# Altium footprint library Connectors Molex.PcbLib: 105 footprints (part 4 of 7)
Each footprint in its own frame and in the unit in brackets; x right, y up, seen from the top. Pads: shape width x height; smd on the part's side, far side on the other; paste and mask are expansions set on the pad; w line width, h text height; cw(c..) or ccw(c..) is an arc to the next point about the centre after c.
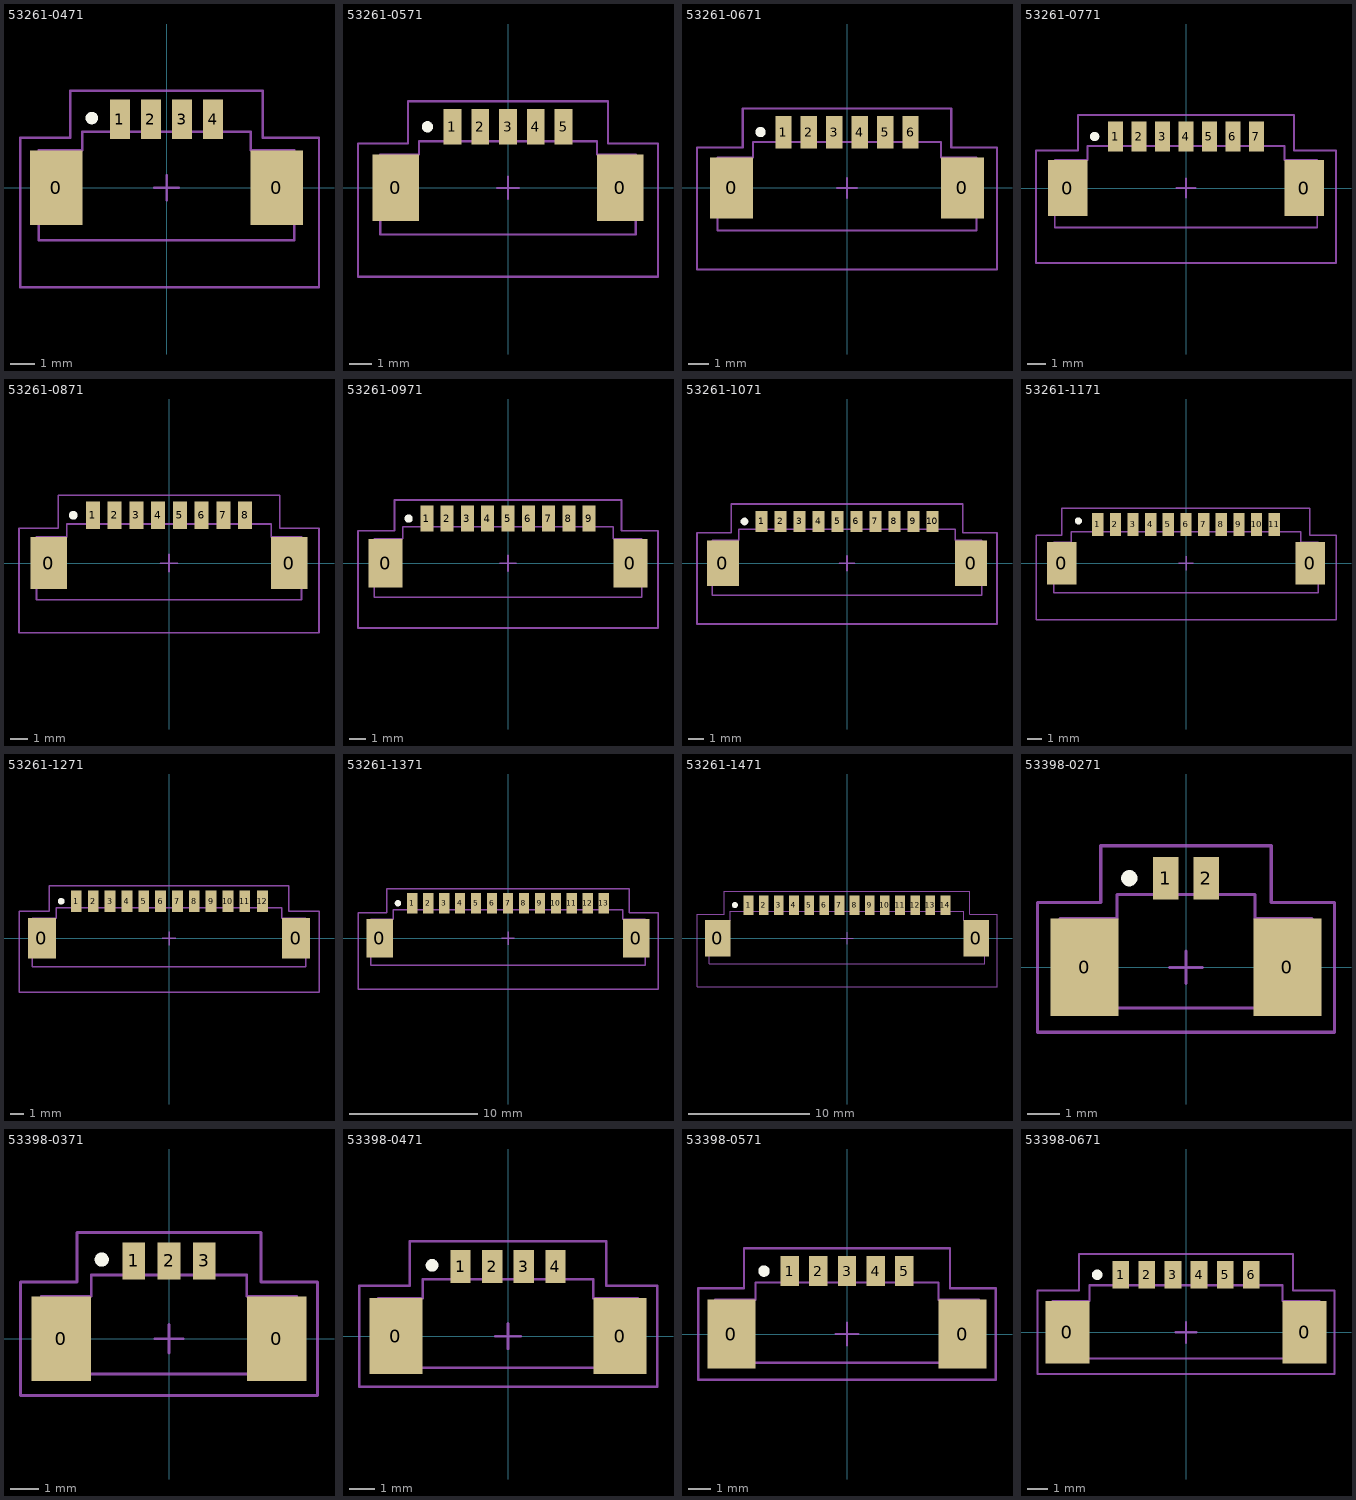
[diagram p3: the footprints below, top view; thin cyan lines are the x and y axes]

## 53261-0471 [mm] "PicoBlade™ 53261-0471"
height 3.4
pads (6):
  rect 2.1x3 smd: 0(-4.425,0) 0(4.425,0)
  rect 0.8x1.6 smd: 1(-1.875,2.75) 2(-0.625,2.75) 3(0.625,2.75) 4(1.875,2.75)
Top Overlay:
  circle w0.25: c-3,2.798 r0.125
Mechanical 1:
  lines w0.1: -5.125,-2.1 -5.125,1.5 -3.375,1.5 -3.375,2.25 3.375,2.25 3.375,1.5 5.125,1.5 5.125,-2.1 -5.125,-2.1
Mechanical 13:
  lines w0.1: -4.125,-0.75 -4.125,1 -4.625,0.5 ; -2.125,2.25 -2.125,3.25 -1.625,3.25 -1.625,2.25 ; -0.875,2.25 -0.875,3.25 -0.375,3.25 -0.375,2.25 ; 0.375,2.25 0.375,3.25 0.875,3.25 0.875,2.25 ; 1.625,2.25 1.625,3.25 2.125,3.25 2.125,2.25 ; -4.625,0.5 -4.625,0.5 ; -5.125,-2.1 -5.125,1.5 -3.375,1.5 -3.375,2.25 3.375,2.25 3.375,1.5 5.125,1.5 5.125,-2.1 -5.125,-2.1
  text ".Designator" at -2.675,-0.25 h1.5
Mechanical 15:
  lines w0.1: -0.5,0 0.5,0 ; 0,-0.5 0,0.5 ; -5.875,-4 -5.875,2 -3.875,2 -3.875,3.9 -3.475,3.9 3.875,3.9 3.875,2 6.125,2 6.125,-4 -5.875,-4
3D body "532610471.stp": height 3.4, standoff 0, extent -5.075,-2.1 5.075,3.1

## 53261-0571 [mm] "PicoBlade™ 53261-0571"
height 3.4
pads (7):
  rect 2.1x3 smd: 0(-5.05,0) 0(5.05,0)
  rect 0.8x1.6 smd: 1(-2.5,2.75) 2(-1.25,2.75) 3(0,2.75) 4(1.25,2.75) 5(2.5,2.75)
Top Overlay:
  circle w0.25: c-3.625,2.75 r0.125
Mechanical 1:
  lines w0.1: -5.75,-2.1 5.75,-2.1 5.75,1.5 4,1.5 4,2.1 -4,2.1 -4,1.5 -5.75,1.5 -5.75,-2.1
Mechanical 13:
  lines w0.1: -5.25,0.5 -4.75,1 -4.75,-0.75 ; -2.75,2.1 -2.75,3.1 -2.25,3.1 -2.25,2.1 ; -1.5,2.1 -1.5,3.1 -1,3.1 -1,2.1 ; -0.25,2.1 -0.25,3.1 0.25,3.1 0.25,2.1 ; 1,2.1 1,3.1 1.5,3.1 1.5,2.1 ; 2.25,2.1 2.25,3.1 2.75,3.1 2.75,2.1 ; -5.75,-2.1 5.75,-2.1 5.75,1.5 4,1.5 4,2.1 -4,2.1 -4,1.5 -5.75,1.5 -5.75,-2.1
  text ".Designator" at -1.85,-0.325 h1.5
Mechanical 15:
  lines w0.1: -0.5,0 0.5,0 ; 0,-0.5 0,0.5 ; -6.75,-4 6.75,-4 6.75,2 4.5,2 4.5,3.9 -4.5,3.9 -4.5,2 -6.75,2 -6.75,-4
3D body "532610571.stp": height 3.4, standoff 0, extent -5.7,-2.1 5.7,3.1

## 53261-0671 [mm] "PicoBlade™ 53261-0671"
height 3.4
pads (8):
  rect 2.1x3 smd: 0(-5.675,0) 0(5.675,0)
  rect 0.8x1.6 smd: 1(-3.125,2.75) 2(-1.875,2.75) 3(-0.625,2.75) 4(0.625,2.75) 5(1.875,2.75) 6(3.125,2.75)
Top Overlay:
  circle w0.25: c-4.25,2.75 r0.125
Mechanical 1:
  lines w0.1: -6.375,-2.1 -6.375,1.5 -4.625,1.5 -4.625,2.25 4.625,2.25 4.625,1.5 6.375,1.5 6.375,-2.1 -6.375,-2.1
Mechanical 13:
  lines w0.1: -5.875,0.5 -5.375,1 -5.375,-0.75 ; -3.375,2.25 -3.375,3.25 -2.875,3.25 -2.875,2.25 ; -2.125,2.25 -2.125,3.25 -1.625,3.25 -1.625,2.25 ; -0.875,2.25 -0.875,3.25 -0.375,3.25 -0.375,2.25 ; 0.375,2.25 0.375,3.25 0.875,3.25 0.875,2.25 ; 1.625,2.25 1.625,3.25 2.125,3.25 2.125,2.25 ; 2.875,2.25 2.875,3.25 3.375,3.25 3.375,2.25 ; -6.375,-2.1 -6.375,1.5 -4.625,1.5 -4.625,2.25 4.625,2.25 4.625,1.5 6.375,1.5 6.375,-2.1 -6.375,-2.1
  text ".Designator" at -1.85,-0.4 h1.5
Mechanical 15:
  lines w0.1: -0.5,0 0.5,0 ; 0,-0.5 0,0.5 ; -7.375,-4 -7.375,2 -5.125,2 -5.125,3.9 -3.475,3.9 5.125,3.9 5.125,2 7.375,2 7.375,-4 -7.375,-4
3D body "532610671.stp": height 3.4, standoff 0, extent -6.325,-2.1 6.325,3.1

## 53261-0771 [mm] "PicoBlade™ 53261-0771"
height 3.4
pads (9):
  rect 2.1x3 smd: 0(-6.3,0) 0(6.3,0)
  rect 0.8x1.6 smd: 1(-3.75,2.75) 2(-2.5,2.75) 3(-1.25,2.75) 4(0,2.75) 5(1.25,2.75) 6(2.5,2.75) 7(3.75,2.75)
Top Overlay:
  circle w0.25: c-4.875,2.75 r0.125
Mechanical 1:
  lines w0.1: -7,-2.1 7,-2.1 7,1.5 5.25,1.5 5.25,2.25 -5.25,2.25 -5.25,1.5 -7,1.5 -7,-2.1
Mechanical 13:
  lines w0.1: -6.5,0.5 -6,1 -6,-0.75 ; -4,2.25 -4,3.25 -3.5,3.25 -3.5,2.25 ; -2.75,2.25 -2.75,3.25 -2.25,3.25 -2.25,2.25 ; -1.5,2.25 -1.5,3.25 -1,3.25 -1,2.25 ; -0.25,2.25 -0.25,3.25 0.25,3.25 0.25,2.25 ; 1,2.25 1,3.25 1.5,3.25 1.5,2.25 ; 2.25,2.25 2.25,3.25 2.75,3.25 2.75,2.25 ; 3.5,2.25 3.5,3.25 4,3.25 4,2.25 ; -7,-2.1 7,-2.1 7,1.5 5.25,1.5 5.25,2.25 -5.25,2.25 -5.25,1.5 -7,1.5 -7,-2.1
  text ".Designator" at -2.05,-0.3 h1.5
Mechanical 15:
  lines w0.1: -0.5,0 0.5,0 ; 0,-0.5 0,0.5 ; -8,-4 8,-4 8,2 5.75,2 5.75,3.9 -2.85,3.9 -5.75,3.9 -5.75,2 -8,2 -8,-4
3D body "532610771.stp": height 3.4, standoff 0, extent -6.95,-2.1 6.95,3.1

## 53261-0871 [mm] "PicoBlade™ 53261-0871"
height 3.4
pads (10):
  rect 2.1x3 smd: 0(-6.925,0) 0(6.925,0)
  rect 0.8x1.6 smd: 1(-4.375,2.75) 2(-3.125,2.75) 3(-1.875,2.75) 4(-0.625,2.75) 5(0.625,2.75) 6(1.875,2.75) 7(3.125,2.75) 8(4.375,2.75)
Top Overlay:
  circle w0.25: c-5.5,2.75 r0.125
Mechanical 1:
  lines w0.1: -7.625,-2.1 7.625,-2.1 7.625,1.5 5.875,1.5 5.875,2.25 -5.875,2.25 -5.875,1.5 -7.625,1.5 -7.625,-2.1
Mechanical 13:
  lines w0.1: -7.125,0.5 -6.625,1 -6.625,-0.75 ; -4.625,2.25 -4.625,3.25 -4.125,3.25 -4.125,2.25 ; -3.375,2.25 -3.375,3.25 -2.875,3.25 -2.875,2.25 ; -2.125,2.25 -2.125,3.25 -1.625,3.25 -1.625,2.25 ; -0.875,2.25 -0.875,3.25 -0.375,3.25 -0.375,2.25 ; 0.375,2.25 0.375,3.25 0.875,3.25 0.875,2.25 ; 1.625,2.25 1.625,3.25 2.125,3.25 2.125,2.25 ; 2.875,2.25 2.875,3.25 3.375,3.25 3.375,2.25 ; 4.125,2.25 4.125,3.25 4.625,3.25 4.625,2.25 ; -7.625,-2.1 7.625,-2.1 7.625,1.5 5.875,1.5 5.875,2.25 -5.875,2.25 -5.875,1.5 -7.625,1.5 -7.625,-2.1
  text ".Designator" at -2.225,-0.375 h1.5
Mechanical 15:
  lines w0.1: -0.5,0 0.5,0 ; 0,-0.5 0,0.5 ; -8.625,-4 8.625,-4 8.625,2 6.375,2 6.375,3.9 -3.475,3.9 -6.375,3.9 -6.375,2 -8.625,2 -8.625,-4
3D body "532610871.stp": height 3.4, standoff 0, extent -7.575,-2.1 7.575,3.1

## 53261-0971 [mm] "PicoBlade™ 53261-0971"
height 3.4
pads (11):
  rect 2.1x3 smd: 0(-7.55,0) 0(7.55,0)
  rect 0.8x1.6 smd: 1(-5,2.75) 2(-3.75,2.75) 3(-2.5,2.75) 4(-1.25,2.75) 5(0,2.75) 6(1.25,2.75) 7(2.5,2.75) 8(3.75,2.75) 9(5,2.75)
Top Overlay:
  circle w0.25: c-6.125,2.75 r0.125
Mechanical 1:
  lines w0.1: -8.25,-2.1 -8.25,1.5 -6.5,1.5 -6.5,2.25 6.5,2.25 6.5,1.5 8.25,1.5 8.25,-2.1 -8.25,-2.1
Mechanical 13:
  lines w0.1: -7.75,0.5 -7.25,1 -7.25,-0.75 ; -5.25,2.25 -5.25,3.25 -4.75,3.25 -4.75,2.25 ; -4,2.25 -4,3.25 -3.5,3.25 -3.5,2.25 ; -2.75,2.25 -2.75,3.25 -2.25,3.25 -2.25,2.25 ; -1.5,2.25 -1.5,3.25 -1,3.25 -1,2.25 ; -0.25,2.25 -0.25,3.25 0.25,3.25 0.25,2.25 ; 1,2.25 1,3.25 1.5,3.25 1.5,2.25 ; 2.25,2.25 2.25,3.25 2.75,3.25 2.75,2.25 ; 3.5,2.25 3.5,3.25 4,3.25 4,2.25 ; 4.75,2.25 4.75,3.25 5.25,3.25 5.25,2.25 ; -8.25,-2.1 -8.25,1.5 -6.5,1.5 -6.5,2.25 6.5,2.25 6.5,1.5 8.25,1.5 8.25,-2.1 -8.25,-2.1
  text ".Designator" at -2.05,-0.325 h1.5
Mechanical 15:
  lines w0.1: -0.5,0 0.5,0 ; 0,-0.5 0,0.5 ; -9.25,-4 -9.25,2 -7,2 -7,3.9 -2.85,3.9 7,3.9 7,2 9.25,2 9.25,-4 -9.25,-4
3D body "532610971.stp": height 3.4, standoff 0, extent -8.2,-2.1 8.2,3.1

## 53261-1071 [mm] "PicoBlade™ 53261-1071"
height 3.4
pads (12):
  rect 2.1x3 smd: 0(-8.175,0) 0(8.175,0)
  rect 0.8x1.4 smd: 1(-5.625,2.75) 2(-4.375,2.75) 3(-3.125,2.75) 4(-1.875,2.75) 5(-0.625,2.75) 6(0.625,2.75) 7(1.875,2.75) 8(3.125,2.75) 9(4.375,2.75) 10(5.625,2.75)
Top Overlay:
  circle w0.25: c-6.75,2.75 r0.125
Mechanical 1:
  lines w0.1: -8.875,-2.1 -8.875,1.5 -7.125,1.5 -7.125,2.25 7.125,2.25 7.125,1.5 8.875,1.5 8.875,-2.1 -8.875,-2.1
Mechanical 13:
  lines w0.1: -8.375,0.5 -7.875,1 -7.875,-0.75 ; -5.875,2.25 -5.875,3.25 -5.375,3.25 -5.375,2.25 ; -4.625,2.25 -4.625,3.25 -4.125,3.25 -4.125,2.25 ; -3.375,2.25 -3.375,3.25 -2.875,3.25 -2.875,2.25 ; -2.125,2.25 -2.125,3.25 -1.625,3.25 -1.625,2.25 ; -0.875,2.25 -0.875,3.25 -0.375,3.25 -0.375,2.25 ; 0.375,2.25 0.375,3.25 0.875,3.25 0.875,2.25 ; 1.625,2.25 1.625,3.25 2.125,3.25 2.125,2.25 ; 2.875,2.25 2.875,3.25 3.375,3.25 3.375,2.25 ; 4.125,2.25 4.125,3.25 4.625,3.25 4.625,2.25 ; 5.375,2.25 5.375,3.25 5.875,3.25 5.875,2.25 ; -8.875,-2.1 -8.875,1.5 -7.125,1.5 -7.125,2.25 7.125,2.25 7.125,1.5 8.875,1.5 8.875,-2.1 -8.875,-2.1
  text ".Designator" at -2.025,-0.35 h1.5
Mechanical 15:
  lines w0.1: -0.5,0 0.5,0 ; 0,-0.5 0,0.5 ; -9.875,-4 -9.875,2 -7.625,2 -7.625,3.9 -3.475,3.9 7.625,3.9 7.625,2 9.875,2 9.875,-4 -9.875,-4
3D body "532611071.stp": height 3.4, standoff 0, extent -8.825,-2.1 8.825,3.1

## 53261-1171 [mm] "PicoBlade™ 53261-1171"
height 3.4
pads (13):
  rect 2.1x3 smd: 0(-8.8,0) 0(8.8,0)
  rect 0.8x1.6 smd: 1(-6.25,2.75) 2(-5,2.75) 3(-3.75,2.75) 4(-2.5,2.75) 5(-1.25,2.75) 6(0,2.75) 7(1.25,2.75) 8(2.5,2.75) 9(3.75,2.75) 10(5,2.75) 11(6.25,2.75)
Top Overlay:
  circle w0.25: c-7.625,3 r0.125
Mechanical 1:
  lines w0.1: -9.375,-2.1 -9.375,1.5 -8.125,1.5 -8.125,2.25 8.125,2.25 8.125,1.5 9.375,1.5 9.375,-2.1 -9.375,-2.1
Mechanical 13:
  lines w0.1: -9,0.5 -8.5,1 -8.5,-0.75 ; -6.5,2.25 -6.5,3.25 -6,3.25 -6,2.25 ; -5.25,2.25 -5.25,3.25 -4.75,3.25 -4.75,2.25 ; -4,2.25 -4,3.25 -3.5,3.25 -3.5,2.25 ; -2.75,2.25 -2.75,3.25 -2.25,3.25 -2.25,2.25 ; -1.5,2.25 -1.5,3.25 -1,3.25 -1,2.25 ; -0.25,2.25 -0.25,3.25 0.25,3.25 0.25,2.25 ; 1,2.25 1,3.25 1.5,3.25 1.5,2.25 ; 2.25,2.25 2.25,3.25 2.75,3.25 2.75,2.25 ; 3.5,2.25 3.5,3.25 4,3.25 4,2.25 ; 4.75,2.25 4.75,3.25 5.25,3.25 5.25,2.25 ; 6,2.25 6,3.25 6.5,3.25 6.5,2.25 ; -9.375,-2.1 -9.375,1.5 -8.125,1.5 -8.125,2.25 8.125,2.25 8.125,1.5 9.375,1.5 9.375,-2.1 -9.375,-2.1
  text ".Designator" at -1.925,-0.35 h1.5
Mechanical 15:
  lines w0.1: -0.5,0 0.5,0 ; 0,-0.5 0,0.5 ; -10.625,-4 10.625,-4 10.625,2 8.75,2 8.75,3.9 -2.85,3.9 -8.8,3.9 -8.8,2 -10.625,2 -10.625,-4
3D body "532611171.stp": height 3.4, standoff 0, extent -9.45,-2.1 9.45,3.1

## 53261-1271 [mm] "PicoBlade™ 53261-1271"
height 3.4
pads (14):
  rect 2.1x3 smd: 0(-9.425,0) 0(9.425,0)
  rect 0.8x1.6 smd: 1(-6.875,2.75) 2(-5.625,2.75) 3(-4.375,2.75) 4(-3.125,2.75) 5(-1.875,2.75) 6(-0.625,2.75) 7(0.625,2.75) 8(1.875,2.75) 9(3.125,2.75) 10(4.375,2.75) 11(5.625,2.75) 12(6.925,2.75)
Top Overlay:
  circle w0.25: c-8,2.75 r0.125
Mechanical 1:
  lines w0.1: -10.125,-2.1 -10.125,1.5 -8.375,1.5 -8.375,2.25 8.375,2.25 8.375,1.5 10.125,1.5 10.125,-2.1 -10.125,-2.1
Mechanical 13:
  lines w0.1: -9.625,0.5 -9.125,1 -9.125,-0.75 ; -7.125,2.25 -7.125,3.25 -6.625,3.25 -6.625,2.25 ; -5.875,2.25 -5.875,3.25 -5.375,3.25 -5.375,2.25 ; -4.625,2.25 -4.625,3.25 -4.125,3.25 -4.125,2.25 ; -3.375,2.25 -3.375,3.25 -2.875,3.25 -2.875,2.25 ; -2.125,2.25 -2.125,3.25 -1.625,3.25 -1.625,2.25 ; -0.875,2.25 -0.875,3.25 -0.375,3.25 -0.375,2.25 ; 0.375,2.25 0.375,3.25 0.875,3.25 0.875,2.25 ; 1.625,2.25 1.625,3.25 2.125,3.25 2.125,2.25 ; 2.875,2.25 2.875,3.25 3.375,3.25 3.375,2.25 ; 4.125,2.25 4.125,3.25 4.625,3.25 4.625,2.25 ; 5.375,2.25 5.375,3.25 5.875,3.25 5.875,2.25 ; 6.625,2.25 6.625,3.25 7.125,3.25 7.125,2.25 ; -10.125,-2.1 -10.125,1.5 -8.375,1.5 -8.375,2.25 8.375,2.25 8.375,1.5 10.125,1.5 10.125,-2.1 -10.125,-2.1
  text ".Designator" at -2.075,-0.3 h1.5
Mechanical 15:
  lines w0.1: -0.5,0 0.5,0 ; 0,-0.5 0,0.5 ; -11.125,-4 -11.125,2 -8.875,2 -8.875,3.9 -4.725,3.9 8.875,3.9 8.875,2 11.125,2 11.125,-4 -11.125,-4
3D body "532611271.stp": height 3.4, standoff 0, extent -10.075,-2.1 10.075,3.1

## 53261-1371 [mm] "PicoBlade™ 53261-1371"
height 3.4
pads (15):
  rect 2.1x3 smd: 0(-10.05,0) 0(10.05,0)
  rect 0.8x1.6 smd: 1(-7.5,2.75) 2(-6.25,2.75) 3(-5,2.75) 4(-3.75,2.75) 5(-2.5,2.75) 6(-1.25,2.75) 7(0,2.75) 8(1.25,2.75) 9(2.5,2.75) 10(3.75,2.75) 11(5,2.75) 12(6.25,2.75) 13(7.5,2.75)
Top Overlay:
  circle w0.25: c-8.625,2.75 r0.125
Mechanical 1:
  lines w0.1: -10.75,-2.1 -10.75,1.5 -9,1.5 -9,2.25 9,2.25 9,1.5 10.75,1.5 10.75,-2.1 -10.75,-2.1
Mechanical 13:
  lines w0.1: -10.25,0.5 -9.75,1 -9.75,-0.75 ; -7.75,2.25 -7.75,3.25 -7.25,3.25 -7.25,2.25 ; -6.5,2.25 -6.5,3.25 -6,3.25 -6,2.25 ; -5.25,2.25 -5.25,3.25 -4.75,3.25 -4.75,2.25 ; -4,2.25 -4,3.25 -3.5,3.25 -3.5,2.25 ; -2.75,2.25 -2.75,3.25 -2.25,3.25 -2.25,2.25 ; -1.5,2.25 -1.5,3.25 -1,3.25 -1,2.25 ; -0.25,2.25 -0.25,3.25 0.25,3.25 0.25,2.25 ; 1,2.25 1,3.25 1.5,3.25 1.5,2.25 ; 2.25,2.25 2.25,3.25 2.75,3.25 2.75,2.25 ; 3.5,2.25 3.5,3.25 4,3.25 4,2.25 ; 4.75,2.25 4.75,3.25 5.25,3.25 5.25,2.25 ; 6,2.25 6,3.25 6.5,3.25 6.5,2.25 ; 7.25,2.25 7.25,3.25 7.75,3.25 7.75,2.25 ; -10.75,-2.1 -10.75,1.5 -9,1.5 -9,2.25 9,2.25 9,1.5 10.75,1.5 10.75,-2.1 -10.75,-2.1
  text ".Designator" at -2.05,-0.35 h1.5
Mechanical 15:
  lines w0.1: -0.5,0 0.5,0 ; 0,-0.5 0,0.5 ; -11.75,-4 -11.75,2 -9.5,2 -9.5,3.9 -5.35,3.9 9.5,3.9 9.5,2 11.75,2 11.75,-4 -11.75,-4
3D body "532611371.stp": height 3.4, standoff 0, extent -10.7,-2.1 10.7,3.1

## 53261-1471 [mm] "PicoBlade™ 53261-1471"
height 3.4
pads (16):
  rect 2.1x3 smd: 0(-10.675,0) 0(10.675,0)
  rect 0.8x1.6 smd: 1(-8.125,2.75) 2(-6.875,2.75) 3(-5.625,2.75) 4(-4.375,2.75) 5(-3.125,2.75) 6(-1.875,2.75) 7(-0.625,2.75) 8(0.625,2.75) 9(1.875,2.75) 10(3.125,2.75) 11(4.375,2.75) 12(5.625,2.75) 13(6.875,2.75) 14(8.125,2.75)
Top Overlay:
  circle w0.25: c-9.25,2.75 r0.125
Mechanical 1:
  lines w0.1: -11.375,-2.1 11.375,-2.1 11.375,1.5 9.625,1.5 9.625,2.25 -9.625,2.25 -9.625,1.5 -11.375,1.5 -11.375,-2.1
Mechanical 13:
  lines w0.1: -10.875,0.5 -10.375,1 -10.375,-0.75 ; -8.375,2.25 -8.375,3.25 -7.875,3.25 -7.875,2.25 ; -7.125,2.25 -7.125,3.25 -6.625,3.25 -6.625,2.25 ; -5.875,2.25 -5.875,3.25 -5.375,3.25 -5.375,2.25 ; -4.625,2.25 -4.625,3.25 -4.125,3.25 -4.125,2.25 ; -3.375,2.25 -3.375,3.25 -2.875,3.25 -2.875,2.25 ; -2.125,2.25 -2.125,3.25 -1.625,3.25 -1.625,2.25 ; -0.875,2.25 -0.875,3.25 -0.375,3.25 -0.375,2.25 ; 0.375,2.25 0.375,3.25 0.875,3.25 0.875,2.25 ; 1.625,2.25 1.625,3.25 2.125,3.25 2.125,2.25 ; 2.875,2.25 2.875,3.25 3.375,3.25 3.375,2.25 ; 4.125,2.25 4.125,3.25 4.625,3.25 4.625,2.25 ; 5.375,2.25 5.375,3.25 5.875,3.25 5.875,2.25 ; 6.625,2.25 6.625,3.25 7.125,3.25 7.125,2.25 ; 7.875,2.25 7.875,3.25 8.375,3.25 8.375,2.25 ; -11.375,-2.1 11.375,-2.1 11.375,1.5 9.625,1.5 9.625,2.25 -9.625,2.25 -9.625,1.5 -11.375,1.5 -11.375,-2.1
  text ".Designator" at -2.05,-0.375 h1.5
Mechanical 15:
  lines w0.1: -0.5,0 0.5,0 ; 0,-0.5 0,0.5 ; -12.375,-4 12.375,-4 12.375,2 10.125,2 10.125,3.9 -5.975,3.9 -10.125,3.9 -10.125,2 -12.375,2 -12.375,-4
3D body "532611471.stp": height 3.4, standoff 0, extent -11.325,-2.1 11.325,3.1

## 53398-0271 [mm] "PicoBlade™ 53398-0271"
height 4.7
pads (4):
  rect 2.1x3 smd: 0(-3.125,0) 0(3.125,0)
  rect 0.8x1.3 smd: 1(-0.625,2.75) 2(0.625,2.75)
Top Overlay:
  circle w0.25: c-1.75,2.75 r0.125
Mechanical 1:
  lines w0.1: -3.875,-1.25 -3.875,1.5 -2.125,1.5 -2.125,2.25 2.125,2.25 2.125,1.5 3.875,1.5 3.875,-1.25 -3.875,-1.25
Mechanical 13:
  lines w0.1: -3.375,0.5 -2.875,1 -2.875,-0.75 ; -0.875,2.25 -0.875,3.25 -0.375,3.25 -0.375,2.25 ; 0.375,2.25 0.375,3.25 0.875,3.25 0.875,2.25 ; -3.875,-1.25 -3.875,1.5 -2.125,1.5 -2.125,2.25 2.125,2.25 2.125,1.5 3.875,1.5 3.875,-1.25 -3.875,-1.25
  text ".Designator" at -1.925,-0.3 h1.5
Mechanical 15:
  lines w0.1: -0.5,0 0.5,0 ; 0,-0.5 0,0.5 ; -4.575,-2 -4.575,2 -2.625,2 -2.625,3.75 2.625,3.75 2.625,2 4.575,2 4.575,-2 -4.575,-2
3D body "533980271.stp": height 4.7, standoff 0, extent -3.825,-1.35 3.825,2.85

## 53398-0371 [mm] "PicoBlade™ 53398-0371"
height 4.7
pads (5):
  rect 2.1x3 smd: 0(-3.8,0) 0(3.8,0)
  rect 0.8x1.3 smd: 1(-1.25,2.75) 2(0,2.75) 3(1.25,2.75)
Top Overlay:
  circle w0.25: c-2.375,2.798 r0.125
Mechanical 1:
  lines w0.1: -4.5,-1.25 4.5,-1.25 4.5,1.5 2.75,1.5 2.75,2.25 -2.75,2.25 -2.75,1.5 -4.5,1.5 -4.5,-1.25
Mechanical 13:
  lines w0.1: -3.5,-0.75 -3.5,1 -4,0.5 ; -1.5,2.25 -1.5,3.25 -1,3.25 -1,2.25 ; -0.25,2.25 -0.25,3.25 0.25,3.25 0.25,2.25 ; 1,2.25 1,3.25 1.5,3.25 1.5,2.25 ; -4,0.5 -4,0.5 ; -4.5,-1.25 4.5,-1.25 4.5,1.5 2.75,1.5 2.75,2.25 -2.75,2.25 -2.75,1.5 -4.5,1.5 -4.5,-1.25
  text ".Designator" at -2.1,-0.3 h1.5
Mechanical 15:
  lines w0.1: -0.5,0 0.5,0 ; 0,-0.5 0,0.5 ; -5.25,-2 5.25,-2 5.25,2 3.25,2 3.25,3.75 -3,3.75 -3.25,3.75 -3.25,2 -5.25,2 -5.25,-2
3D body "533980371.stp": height 4.7, standoff 0, extent -4.45,-1.35 4.45,2.85

## 53398-0471 [mm] "PicoBlade™ 553398-0471"
height 4.7
pads (6):
  rect 2.1x3 smd: 0(-4.425,0) 0(4.425,0)
  rect 0.8x1.3 smd: 1(-1.875,2.75) 2(-0.625,2.75) 3(0.625,2.75) 4(1.875,2.75)
Top Overlay:
  circle w0.25: c-3,2.798 r0.125
Mechanical 1:
  lines w0.1: -5.125,-1.25 5.125,-1.25 5.125,1.5 3.375,1.5 3.375,2.25 -3.375,2.25 -3.375,1.5 -5.125,1.5 -5.125,-1.25
Mechanical 13:
  lines w0.1: -4.125,-0.75 -4.125,1 -4.625,0.5 ; -2.125,2.25 -2.125,3.25 -1.625,3.25 -1.625,2.25 ; -0.875,2.25 -0.875,3.25 -0.375,3.25 -0.375,2.25 ; 0.375,2.25 0.375,3.25 0.875,3.25 0.875,2.25 ; 1.625,2.25 1.625,3.25 2.125,3.25 2.125,2.25 ; -4.625,0.5 -4.625,0.5 ; -5.125,-1.25 5.125,-1.25 5.125,1.5 3.375,1.5 3.375,2.25 -3.375,2.25 -3.375,1.5 -5.125,1.5 -5.125,-1.25
  text ".Designator" at -2.125,-0.3 h1.5
Mechanical 15:
  lines w0.1: -0.5,0 0.5,0 ; 0,-0.5 0,0.5 ; -5.875,-2 5.9,-2 5.9,2 3.875,2 3.875,3.75 -3.625,3.75 -3.875,3.75 -3.875,2 -5.875,2 -5.875,-2
3D body "533980471.stp": height 4.7, standoff 0, extent -5.075,-1.35 5.075,2.85

## 53398-0571 [mm] "PicoBlade™ 53398-0571"
height 4.7
pads (7):
  rect 2.1x3 smd: 0(-5.05,0) 0(5.05,0)
  rect 0.8x1.3 smd: 1(-2.5,2.75) 2(-1.25,2.75) 3(0,2.75) 4(1.25,2.75) 5(2.5,2.75)
Top Overlay:
  circle w0.25: c-3.625,2.75 r0.125
Mechanical 1:
  lines w0.1: -5.75,-1.25 -5.75,1.5 -4,1.5 -4,2.25 4,2.25 4,1.5 5.75,1.5 5.75,-1.25 -5.75,-1.25
Mechanical 13:
  lines w0.1: -5.25,0.5 -4.75,1 -4.75,-0.75 ; -2.75,2.25 -2.75,3.25 -2.25,3.25 -2.25,2.25 ; -1.5,2.25 -1.5,3.25 -1,3.25 -1,2.25 ; -0.25,2.25 -0.25,3.25 0.25,3.25 0.25,2.25 ; 1,2.25 1,3.25 1.5,3.25 1.5,2.25 ; 2.25,2.25 2.25,3.25 2.75,3.25 2.75,2.25 ; -5.75,-1.25 -5.75,1.5 -4,1.5 -4,2.25 4,2.25 4,1.5 5.75,1.5 5.75,-1.25 -5.75,-1.25
  text ".Designator" at -2,-0.325 h1.5
Mechanical 15:
  lines w0.1: -0.5,0 0.5,0 ; 0,-0.5 0,0.5 ; -6.5,-2 -6.5,2 -4.5,2 -4.5,3.75 -3,3.75 4.5,3.75 4.5,2 6.5,2 6.5,-2 -6.5,-2
3D body "533980571.stp": height 4.7, standoff 0, extent -5.7,-1.35 5.7,2.85

## 53398-0671 [mm] "PicoBlade™ 53398-0671"
height 4.7
pads (8):
  rect 2.1x3 smd: 0(-5.675,0) 0(5.675,0)
  rect 0.8x1.3 smd: 1(-3.125,2.75) 2(-1.875,2.75) 3(-0.625,2.75) 4(0.625,2.75) 5(1.875,2.75) 6(3.125,2.75)
Top Overlay:
  circle w0.25: c-4.25,2.75 r0.125
Mechanical 1:
  lines w0.1: -6.375,-1.25 -6.375,1.5 -4.625,1.5 -4.625,2.25 4.625,2.25 4.625,1.5 6.375,1.5 6.375,-1.25 -6.375,-1.25
Mechanical 13:
  lines w0.1: -5.875,0.5 -5.375,1 -5.375,-0.75 ; -3.375,2.25 -3.375,3.25 -2.875,3.25 -2.875,2.25 ; -2.125,2.25 -2.125,3.25 -1.625,3.25 -1.625,2.25 ; -0.875,2.25 -0.875,3.25 -0.375,3.25 -0.375,2.25 ; 0.375,2.25 0.375,3.25 0.875,3.25 0.875,2.25 ; 1.625,2.25 1.625,3.25 2.125,3.25 2.125,2.25 ; 2.875,2.25 2.875,3.25 3.375,3.25 3.375,2.25 ; -6.375,-1.25 -6.375,1.5 -4.625,1.5 -4.625,2.25 4.625,2.25 4.625,1.5 6.375,1.5 6.375,-1.25 -6.375,-1.25
  text ".Designator" at -1.875,-0.3 h1.5
Mechanical 15:
  lines w0.1: -0.5,0 0.5,0 ; 0,-0.5 0,0.5 ; -7.1,-2 -7.1,2 -5.125,2 -5.125,3.75 -3.625,3.75 5.125,3.75 5.125,2 7.1,2 7.1,-2 -7.1,-2
3D body "533980671.stp": height 4.7, standoff 0, extent -6.325,-1.35 6.325,2.85